# Altium footprint library standard.PcbLib: 227 footprints (part 14 of 15)
Each footprint in its own frame and in the unit in brackets; x right, y up, seen from the top. Pads: shape width x height; smd on the part's side, far side on the other; paste and mask are expansions set on the pad; w line width, h text height; cw(c..) or ccw(c..) is an arc to the next point about the centre after c.
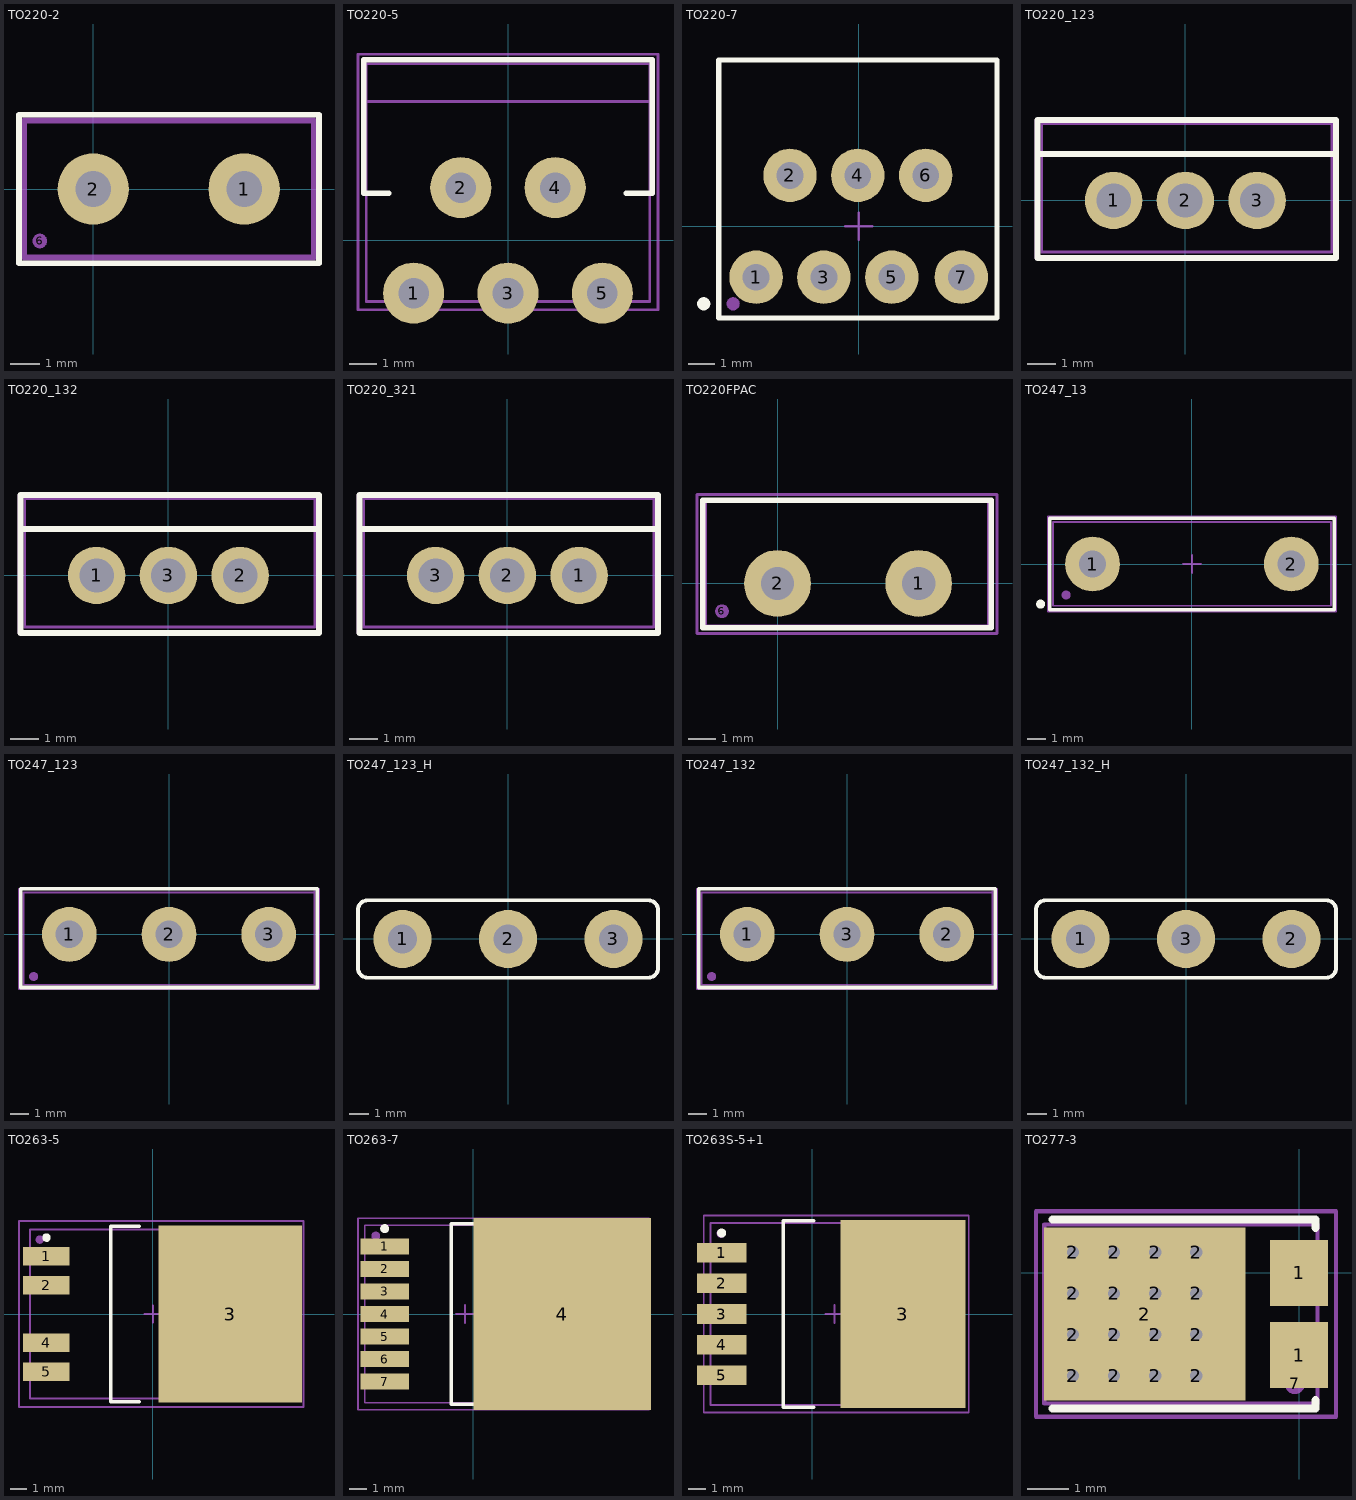
[diagram p13: the footprints below, top view; thin cyan lines are the x and y axes]

## TO220-2 [mm]
pads (3):
  round 2.4 hole 1.2: 1(5.08,0) 2(0,0)
  round 0.5 on Mech1: 6(-1.8,-1.75)
Top Overlay:
  lines w0.2: -2.5,-2.5 -2.5,2.5 7.6,2.5 7.6,-2.5 -2.5,-2.5
Mechanical 1:
  lines w0.1: -2.276,-2.25 -2.276,2.25 7.376,2.25 7.376,-2.25 -2.276,-2.25
Mechanical 15:
  lines w0.1: -2.35,-2.35 -2.35,2.35 7.45,2.35 7.45,-2.35 -2.35,-2.35
3D body "User Library-TO 220-2.STEP": height 20.3, standoff -8.08, extent -2.276,-2.25 7.376,2.25

## TO220-5 [mm] "5-Lead Plastic TO-220"
height 20
pads (5):
  round 2.2 hole 1.1: 1(-3.4,-1.9) 2(-1.7,1.9) 3(0,-1.9) 4(1.7,1.9) 5(3.4,-1.9)
Top Overlay:
  lines w0.2: -4.3,1.7 -5.2,1.7 -5.2,6.5 5.2,6.5 5.2,1.7 4.25,1.7
Mechanical 1:
  lines w0.1: -5.1,5 5.1,5 ; -5.1,-2.2 -5.1,6.356 5.1,6.356 5.1,-2.2 -5.1,-2.2
Mechanical 15:
  lines w0.1: -5.4,-2.5 -5.4,6.7 5.4,6.7 5.4,-2.5 -5.4,-2.5
3D body "TO220-5.step": height 19, standoff -9.28, extent -5.1,-2.2 5.1,6.356

## TO220-7 [mm]
height 20
pads (9):
  round 2 hole 1: 1(-3.84,-1.905) 2(-2.57,1.905) 3(-1.3,-1.905) 4(-0.03,1.905) 5(1.24,-1.905) 6(2.51,1.905) 7(3.84,-1.905)
  round 0.5 on Top Overlay: ""(-5.8,-2.9)
  round 0.5 on Mech1: ""(-4.7,-2.9)
Top Overlay:
  lines w0.2: -5.237,-3.429 5.177,-3.429 5.177,6.223 -5.237,6.223 -5.237,-3.429
Mechanical 1:
  lines w0.1: -5.237,-3.429 5.177,-3.429 5.177,6.223 -5.237,6.223 -5.237,-3.429
Mechanical 15:
  lines w0.05: -5.237,-3.429 -5.237,6.223 5.177,6.223 5.177,-3.429 -5.237,-3.429
  lines w0.1: -0.5,0 0.5,0 ; 0,-0.5 0,0.5
3D body "R-PZFM-T7.STEP": height 21, standoff -3.35, extent -5.04,-2.205 4.96,6.045

## TO220_123 [mm] "Generic TO-220 case, stay variant"
height 22
pads (3):
  round 2 hole 1.2: 1(-2.5,0) 2(0,0) 3(2.5,0)
Top Overlay:
  lines w0.2: -5.15,1.619 5.247,1.619 ; -5.15,-2 5.247,-2 5.247,2.8 -5.15,2.8 -5.15,-2
Mechanical 1:
  lines w0.1: -5,1.6 5.1,1.6 ; -5,-1.8 -5,2.675 5.1,2.675 5.1,-1.8 -5,-1.8
Mechanical 15:
  lines w0.1: -0.5,0 0.5,0 ; 0,-0.5 0,0.5 ; -5.2,-2 5.247,-2 5.247,2.8 -5.2,2.8 -5.2,-2
3D body "User Library-TO-220-4.STEP": height 22.06, standoff -6.74, extent -5,-1.8 5.2,2.7

## TO220_132 [mm] "Generic TO-220 case, stay variant"
height 22
pads (3):
  round 2 hole 1.2: 1(-2.5,0) 2(2.5,0) 3(0,0)
Top Overlay:
  lines w0.2: -5.15,1.619 5.247,1.619 ; -5.15,-2 5.247,-2 5.247,2.8 -5.15,2.8 -5.15,-2
Mechanical 1:
  lines w0.1: -5,1.6 5.1,1.6 ; -5,-1.8 -5,2.675 5.1,2.675 5.1,-1.8 -5,-1.8
Mechanical 15:
  lines w0.1: -0.5,0 0.5,0 ; 0,-0.5 0,0.5 ; -5.2,-2 5.247,-2 5.247,2.8 -5.2,2.8 -5.2,-2
3D body "User Library-TO-220-4.STEP": height 22.06, standoff -6.74, extent -5,-1.8 5.2,2.7

## TO220_321 [mm] "Generic TO-220 case, stay variant"
height 22
pads (3):
  round 2 hole 1.2: 1(2.5,0) 2(0,0) 3(-2.5,0)
Top Overlay:
  lines w0.2: -5.15,1.619 5.247,1.619 ; -5.15,-2 -5.15,2.8 5.247,2.8 5.247,-2 -5.15,-2
Mechanical 1:
  lines w0.1: -5,1.6 5.1,1.6 ; -5,-1.8 5.1,-1.8 5.1,2.675 -5,2.675 -5,-1.8
Mechanical 15:
  lines w0.1: -0.5,0 0.5,0 ; 0,-0.5 0,0.5 ; -5.2,-2 -5.2,2.8 5.247,2.8 5.247,-2 -5.2,-2
3D body "User Library-TO-220-4.STEP": height 22.06, standoff -6.74, extent -5,-1.8 5.2,2.7

## TO220FPAC [mm]
pads (3):
  round 2.4 hole 1.2: 1(5.08,0) 2(0,0)
  round 0.5 on Mech1: 6(-2,-1)
Top Overlay:
  lines w0.2: -2.7,-1.6 7.7,-1.6 7.7,3 -2.7,3 -2.7,-1.6
Mechanical 1:
  lines w0.1: -2.59,-1.533 7.59,-1.533 7.59,2.977 -2.59,2.977 -2.59,-1.533
Mechanical 15:
  lines w0.1: -2.9,-1.8 -2.9,3.2 7.9,3.2 7.9,-1.8 -2.9,-1.8
3D body "TO-220FPAC.stp": height 21.15, standoff -8.45, extent -2.59,-1.533 7.59,2.977

## TO247_13 [mm] "3-Lead Plastic TO-247"
height 20
pads (4):
  round 3 hole 1.5: 1(-5.45,0) 2(5.45,0)
  round 0.5 on Top Overlay: ""(-8.3,-2.2)
  round 0.5 on Mech1: ""(-6.9,-1.7)
Top Overlay:
  lines w0.2: -7.8,-2.5 -7.8,2.5 7.8,2.5 7.8,-2.5 -7.8,-2.5
Mechanical 1:
  lines w0.1: -7.62,-2.286 -7.62,2.311 7.62,2.311 7.62,-2.286 -7.62,-2.286
Mechanical 15:
  lines w0.1: -0.5,0 0.5,0 ; 0,-0.5 0,0.5 ; -7.9,-2.6 7.9,-2.6 7.9,2.6 -7.9,2.6 -7.9,-2.6
3D body "User Library-TO-247-2_PIN.STEP": height 24.33, standoff -11.73, extent -7.62,-2.286 7.62,2.311

## TO247_123 [mm] "3-Lead Plastic TO-247"
height 20
pads (4):
  round 3 hole 1.5: 1(-5.45,0) 2(0,0) 3(5.45,0)
  round 0.5 on Mech1: ""(-7.4,-2.3)
Top Overlay:
  lines w0.2: -8.1,-2.9 -8.1,2.5 8.1,2.5 8.1,-2.9 -8.1,-2.9
Mechanical 1:
  lines w0.1: -7.95,2.3 -7.95,2.3 ; -7.95,2.3 -7.95,-2.75 7.95,-2.75 7.95,2.35 7.9,2.3 -7.95,2.3
Mechanical 15:
  lines w0.1: -0.5,0 0.5,0 ; 0,-0.5 0,0.5 ; -8.2,-3 8.2,-3 8.2,2.5 -8.2,2.5 -8.2,-3
3D body "TO247_3_21.STEP": height 26.95, standoff -2.47, extent -7.95,-2.75 7.95,2.35

## TO247_123_H [mm] "3-Lead Plastic TO-247"
height 20
pads (3):
  round 3 hole 1.5: 1(-5.45,0) 2(0,0) 3(5.45,0)
Top Overlay:
  lines w0.2: -7.75,-1.5 ccw(c-7.25,-1.5) -7.25,-2 7.25,-2 ccw(c7.25,-1.5) 7.75,-1.5 7.75,1.5 ccw(c7.25,1.5) 7.25,2 -7.25,2 ccw(c-7.25,1.5) -7.75,1.5 -7.75,-1.5
Mechanical 1:
  lines w0.1: -7.75,-1.5 ccw(c-7.25,-1.5) -7.25,-2 7.25,-2 ccw(c7.25,-1.5) 7.75,-1.5 7.75,1.5 ccw(c7.25,1.5) 7.25,2 -7.25,2 ccw(c-7.25,1.5) -7.75,1.5 -7.75,-1.5
Mechanical 15:
  lines w0.1: -0.5,0 0.5,0 ; 0,-0.5 0,0.5 ; -7.75,-1.5 ccw(c-7.25,-1.5) -7.25,-2 7.25,-2 ccw(c7.25,-1.5) 7.75,-1.5 7.75,1.5 ccw(c7.25,1.5) 7.25,2 -7.25,2 ccw(c-7.25,1.5) -7.75,1.5 -7.75,-1.5
3D body "User Library-TO-247H.STEP": height 3.9, standoff -8, extent -7.75,-0.3 7.75,28.1

## TO247_132 [mm] "3-Lead Plastic TO-247"
height 20
pads (4):
  round 3 hole 1.5: 1(-5.45,0) 2(5.45,0) 3(0,0)
  round 0.5 on Mech1: ""(-7.4,-2.3)
Top Overlay:
  lines w0.2: -8.1,-2.9 -8.1,2.5 8.1,2.5 8.1,-2.9 -8.1,-2.9
Mechanical 1:
  lines w0.1: -7.95,2.3 -7.95,2.3 ; -7.95,2.3 -7.95,-2.75 7.95,-2.75 7.95,2.35 7.9,2.3 -7.95,2.3
Mechanical 15:
  lines w0.1: -0.5,0 0.5,0 ; 0,-0.5 0,0.5 ; -8.2,-3 8.2,-3 8.2,2.5 -8.2,2.5 -8.2,-3
3D body "TO247_3_21.STEP": height 26.95, standoff -2.47, extent -7.95,-2.75 7.95,2.35

## TO247_132_H [mm] "3-Lead Plastic TO-247"
height 20
pads (3):
  round 3 hole 1.5: 1(-5.45,0) 2(5.45,0) 3(0,0)
Top Overlay:
  lines w0.2: -7.75,-1.5 ccw(c-7.25,-1.5) -7.25,-2 7.25,-2 ccw(c7.25,-1.5) 7.75,-1.5 7.75,1.5 ccw(c7.25,1.5) 7.25,2 -7.25,2 ccw(c-7.25,1.5) -7.75,1.5 -7.75,-1.5
Mechanical 1:
  lines w0.1: -7.75,-1.5 ccw(c-7.25,-1.5) -7.25,-2 7.25,-2 ccw(c7.25,-1.5) 7.75,-1.5 7.75,1.5 ccw(c7.25,1.5) 7.25,2 -7.25,2 ccw(c-7.25,1.5) -7.75,1.5 -7.75,-1.5
Mechanical 15:
  lines w0.1: -0.5,0 0.5,0 ; 0,-0.5 0,0.5 ; -7.75,-1.5 ccw(c-7.25,-1.5) -7.25,-2 7.25,-2 ccw(c7.25,-1.5) 7.75,-1.5 7.75,1.5 ccw(c7.25,1.5) 7.25,2 -7.25,2 ccw(c-7.25,1.5) -7.75,1.5 -7.75,-1.5
3D body "User Library-TO-247H.STEP": height 3.9, standoff -8, extent -7.75,-0.3 7.75,28.1

## TO263-5 [mm]
height 4.65
pads (6):
  rect 2.75x1.1 smd: 1(-6.3,3.42) 2(-6.3,1.71) 4(-6.3,-1.71) 5(-6.3,-3.42)
  rect 8.5x10.5 smd: 3(4.572,0)
  round 0.5 on Mech1: ""(-6.7,4.4)
Top Overlay:
  circle w0.25: c-6.3,4.52 r0.125
  lines w0.2: -0.8,-5.2 -2.5,-5.2 -2.5,5.2 -0.8,5.2
Mechanical 1:
  lines w0.1: -7.276,-5 -7.276,5 8.394,5 8.394,-5 -7.276,-5
Mechanical 15:
  lines w0.1: -0.5,0 0.5,0 ; 0,-0.5 0,0.5 ; -7.925,-5.5 8.9,-5.5 8.9,5.5 -7.925,5.5 -7.925,-5.5
3D body "TO263-5S.STEP": height 4.93, standoff 0.13, extent -7.276,-5 8.394,5

## TO263-7 [mm] "TO263-7 (D2Pak, 7-Pads)"
height 4.6
pads (9):
  rect 2.75x0.89 smd paste+0: 1(-5,3.81) 4(-5,0)
  rect 2.75x0.89 smd: 2(-5,2.54) 3(-5,1.27) 5(-5,-1.27) 6(-5,-2.54) 7(-5,-3.81)
  rect 10x10.8 smd: 4(5,0)
  round 0.5 on Mech1: ""(-5.5,4.4)
Top Overlay:
  circle w0.25: c-5,4.81 r0.125
  lines w0.2: 0.923,-5.08 -1.25,-5.08 -1.25,5.08 0.93,5.08
Mechanical 1:
  lines w0.1: -6.117,-5 -6.117,5 9.553,5 9.553,-5 -6.117,-5
Mechanical 15:
  lines w0.1: -0.974,0 0.026,0 ; -0.472,-0.5 -0.472,0.5 ; -6.502,-5.4 -6.498,5.4 9.9,5.4 9.9,-5.4 -6.502,-5.4
3D body "TO263-7-1.STEP": height 4.83, standoff 0.03, extent -6.117,-5 9.553,5

## TO263S-5+1 [mm]
height 4.65
pads (7):
  rect 2.75x1.1 smd: 1(-5.062,3.42) 2(-5.062,1.71) 3(-5.062,0) 4(-5.062,-1.71) 5(-5.062,-3.42)
  rect 7x10.5 smd: 3(5.063,0)
  round 0.5 on Mech1: ""(-5.1,4.5)
Top Overlay:
  circle w0.25: c-5.062,4.52 r0.125
  lines w0.2: 0.088,-5.2 -1.612,-5.2 -1.612,5.2 0.088,5.2
Mechanical 1:
  lines w0.1: -5.69,-5.08 -5.69,5.08 8.325,5.08 8.325,-5.08 -5.69,-5.08
Mechanical 15:
  lines w0.1: 0.738,0 1.738,0 ; 1.238,-0.5 1.238,0.5 ; -6.062,-5.5 8.738,-5.5 8.738,5.5 -6.062,5.5 -6.062,-5.5
3D body "TO263-5+1.STEP": height 4.56, standoff 0, extent -5.69,-5.08 8.325,5.08

## TO277-3 [mm]
pads (20):
  rect 1.4x1.6 smd: 1(0,-2) 1(0,0)
  round 0.7 hole 0.3: 2(-5.5,-2.5) 2(-5.5,-1.5) 2(-5.5,-0.5) 2(-5.5,0.5) 2(-4.5,-2.5) 2(-4.5,-1.5) 2(-4.5,-0.5) 2(-4.5,0.5) 2(-3.5,-2.5) 2(-3.5,-1.5) 2(-3.5,-0.5) 2(-3.5,0.5) 2(-2.5,-2.5) 2(-2.5,-1.5) 2(-2.5,-0.5) 2(-2.5,0.5)
  rect 4.9x4.2 smd: 2(-3.75,-1)
  round 0.5 on Mech1: 7(-0.1,-2.7)
Top Overlay:
  lines w0.2: -6,-3.3 0.4,-3.3 0.4,-3.1 ; -6,1.3 0.4,1.3 0.4,1.1
Mechanical 1:
  lines w0.1: -6.2,1.175 0.45,1.175 0.45,-3.175 -6.2,-3.175 -6.2,1.175 ; -6.2,1.175 -6.2,1.175
Mechanical 15:
  lines w0.1: -6.4,-3.5 0.9,-3.5 0.9,1.5 -6.4,1.5 -6.4,-3.5
3D body "TO-277_3L.stp": height 1.25, standoff 0, extent -6.2,-3.175 0.45,1.175